# Altium footprint library AI.PcbLib: 137 footprints (part 4 of 9)
Each footprint in its own frame and in the unit in brackets; x right, y up, seen from the top. Pads: shape width x height; smd on the part's side, far side on the other; paste and mask are expansions set on the pad; w line width, h text height; cw(c..) or ccw(c..) is an arc to the next point about the centre after c.
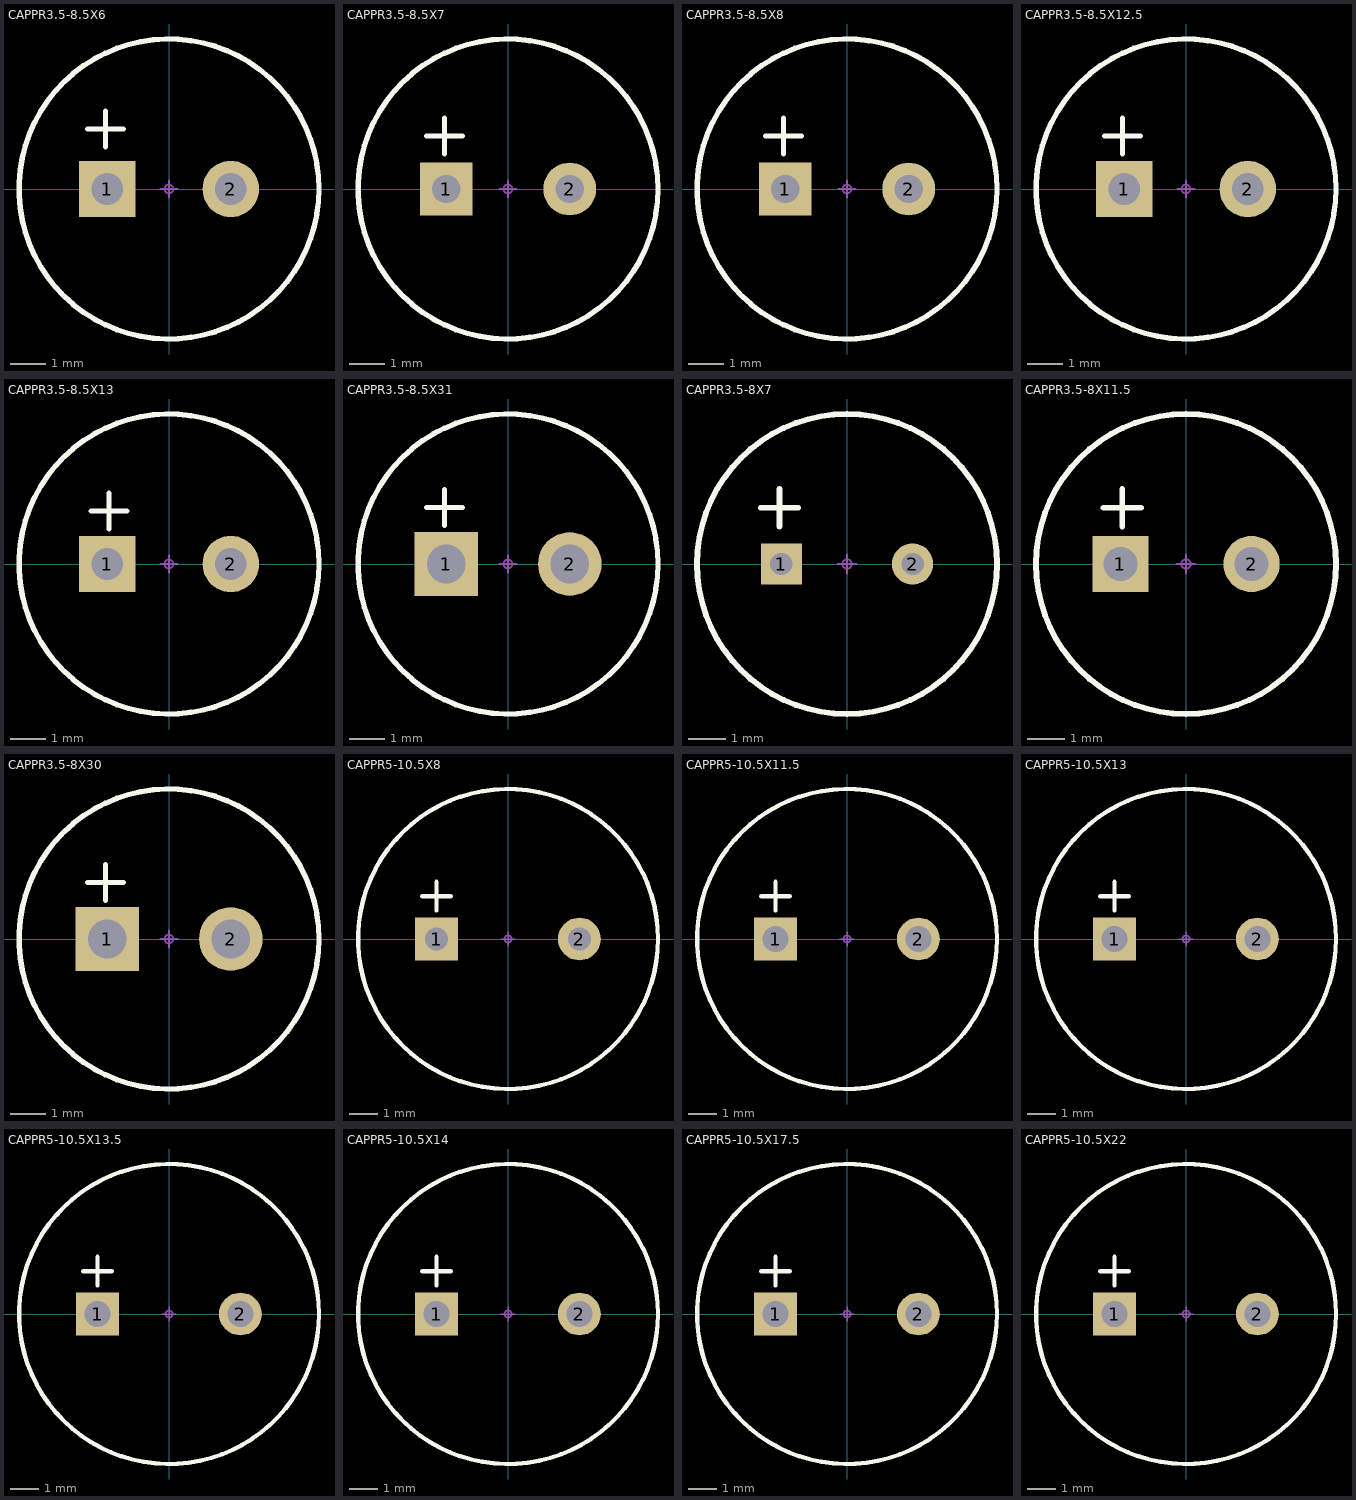
[diagram p3: the footprints below, top view; thin cyan lines are the x and y axes]

## CAPPR3.5-8.5X6 [mm]
pads (2):
  rect 1.6x1.6 hole 0.9: 1(-1.75,0)
  round 1.6 hole 0.9: 2(1.75,0)
Top Overlay:
  circle w0.152: c0,0 r4.25
  lines w0.152: -2.3,1.7 -1.3,1.7 ; -1.8,1.2 -1.8,2.2
Mechanical 15:
  circle w0.05: c0,0 r0.125
  lines w0.05: -0.25,0 0.25,0 ; 0,-0.25 0,0.25
3D body "CAPPR350-850X600.stp": height 6, standoff -3.6, extent -4.259,-4.259 4.241,4.241

## CAPPR3.5-8.5X7 [mm]
pads (2):
  rect 1.5x1.5 hole 0.8: 1(-1.75,0)
  round 1.5 hole 0.8: 2(1.75,0)
Top Overlay:
  circle w0.152: c0,0 r4.25
  lines w0.152: -2.3,1.5 -1.3,1.5 ; -1.8,1 -1.8,2
Mechanical 15:
  circle w0.05: c0,0 r0.125
  lines w0.05: -0.25,0 0.25,0 ; 0,-0.25 0,0.25
3D body "CAPPR350-850X700.stp": height 7, standoff -3.6, extent -4.25,-4.254 4.25,4.246

## CAPPR3.5-8.5X8 [mm]
pads (2):
  rect 1.5x1.5 hole 0.8: 1(-1.75,0)
  round 1.5 hole 0.8: 2(1.75,0)
Top Overlay:
  circle w0.152: c0,0 r4.25
  lines w0.152: -2.3,1.5 -1.3,1.5 ; -1.8,1 -1.8,2
Mechanical 15:
  circle w0.05: c0,0 r0.125
  lines w0.05: -0.25,0 0.25,0 ; 0,-0.25 0,0.25
3D body "CAPPR350-850X800.stp": height 8, standoff -3.6, extent -4.25,-4.25 4.25,4.25

## CAPPR3.5-8.5X12.5 [mm]
pads (2):
  rect 1.6x1.6 hole 0.9: 1(-1.75,0)
  round 1.6 hole 0.9: 2(1.75,0)
Top Overlay:
  circle w0.152: c0,0 r4.25
  lines w0.152: -2.3,1.5 -1.3,1.5 ; -1.8,1 -1.8,2
Mechanical 15:
  circle w0.05: c0,0 r0.125
  lines w0.05: -0.25,0 0.25,0 ; 0,-0.25 0,0.25
3D body "CAPPR350-850X1250.stp": height 12.5, standoff -3.6, extent -4.25,-4.25 4.25,4.25

## CAPPR3.5-8.5X13 [mm]
pads (2):
  rect 1.6x1.6 hole 0.9: 1(-1.75,0)
  round 1.6 hole 0.9: 2(1.75,0)
Top Overlay:
  circle w0.152: c0,0 r4.25
  lines w0.152: -2.2,1.5 -1.2,1.5 ; -1.7,1 -1.7,2
Mechanical 15:
  circle w0.05: c0,0 r0.125
  lines w0.05: -0.25,0 0.25,0 ; 0,-0.25 0,0.25
3D body "CAPPR350-850X1300.stp": height 13, standoff -3.6, extent -4.25,-4.25 4.25,4.25

## CAPPR3.5-8.5X31 [mm]
pads (2):
  rect 1.8x1.8 hole 1.1: 1(-1.75,0)
  round 1.8 hole 1.1: 2(1.75,0)
Top Overlay:
  circle w0.152: c0,0 r4.25
  lines w0.152: -2.3,1.6 -1.3,1.6 ; -1.8,1.1 -1.8,2.1
Mechanical 15:
  circle w0.05: c0,0 r0.125
  lines w0.05: -0.25,0 0.25,0 ; 0,-0.25 0,0.25
3D body "CAPPR350-850X3100.stp": height 31, standoff -3.8, extent -4.25,-4.25 4.25,4.25

## CAPPR3.5-8X7 [mm]
pads (2):
  rect 1.1x1.1 hole 0.6: 1(-1.75,0)
  round 1.1 hole 0.6: 2(1.75,0)
Top Overlay:
  circle w0.152: c0,0 r4
  lines w0.152: -2.3,1.5 -1.3,1.5 ; -1.8,1 -1.8,2
Mechanical 15:
  circle w0.05: c0,0 r0.125
  lines w0.05: -0.25,0 0.25,0 ; 0,-0.25 0,0.25
3D body "CAPPR350-800X700.stp": height 7, standoff -3.6, extent -4.259,-4.263 4.241,4.237

## CAPPR3.5-8X11.5 [mm]
pads (2):
  rect 1.5x1.5 hole 0.9: 1(-1.75,0)
  round 1.5 hole 0.9: 2(1.75,0)
Top Overlay:
  circle w0.152: c0,0 r4
  lines w0.152: -2.2,1.5 -1.2,1.5 ; -1.7,1 -1.7,2
Mechanical 15:
  circle w0.05: c0,0 r0.125
  lines w0.05: -0.25,0 0.25,0 ; 0,-0.25 0,0.25
3D body "CAPPR350-800X1150.stp": height 11.5, standoff -3.6, extent -4.012,-4.029 3.988,3.971

## CAPPR3.5-8X30 [mm] "Capacitor, Radial, Pin spacing 3.5mm - Body Diameter 8.5mm x Body Height 13mm"
height 13
pads (2):
  rect 1.8x1.8 hole 1.1: 1(-1.75,0)
  round 1.8 hole 1.1: 2(1.75,0)
Top Overlay:
  circle w0.152: c0,0 r4.25
  lines w0.152: -2.3,1.6 -1.3,1.6 ; -1.8,1.1 -1.8,2.1
Mechanical 15:
  circle w0.05: c0,0 r0.125
  lines w0.05: -0.25,0 0.25,0 ; 0,-0.25 0,0.25
3D body "CAPPR350-850X1300.stp": height 13, standoff -3.6, extent -4.25,-4.25 4.25,4.25

## CAPPR5-10.5X8 [mm]
pads (2):
  rect 1.5x1.5 hole 0.8: 1(-2.5,0)
  round 1.5 hole 0.8: 2(2.5,0)
Top Overlay:
  circle w0.152: c0,0 r5.25
  lines w0.152: -3,1.5 -2,1.5 ; -2.5,1 -2.5,2
Mechanical 15:
  circle w0.05: c0,0 r0.125
  lines w0.05: -0.25,0 0.25,0 ; 0,-0.25 0,0.25
3D body "CAPPR500-1050X800.stp": height 8, standoff -3.6, extent -5.25,-5.25 5.25,5.25

## CAPPR5-10.5X11.5 [mm]
pads (2):
  rect 1.5x1.5 hole 0.9: 1(-2.5,0)
  round 1.5 hole 0.9: 2(2.5,0)
Top Overlay:
  circle w0.152: c0,0 r5.25
  lines w0.152: -3,1.5 -2,1.5 ; -2.5,1 -2.5,2
Mechanical 15:
  circle w0.05: c0,0 r0.125
  lines w0.05: -0.25,0 0.25,0 ; 0,-0.25 0,0.25
3D body "CAPPR500-1050X1150.stp": height 11.5, standoff -3.6, extent -5.25,-5.25 5.25,5.25

## CAPPR5-10.5X13 [mm]
pads (2):
  rect 1.5x1.5 hole 0.9: 1(-2.5,0)
  round 1.5 hole 0.9: 2(2.5,0)
Top Overlay:
  circle w0.152: c0,0 r5.25
  lines w0.152: -3,1.5 -2,1.5 ; -2.5,1 -2.5,2
Mechanical 15:
  circle w0.05: c0,0 r0.125
  lines w0.05: -0.25,0 0.25,0 ; 0,-0.25 0,0.25
3D body "CAPPR500-1050X1300.stp": height 13, standoff -3.6, extent -5.25,-5.25 5.25,5.25

## CAPPR5-10.5X13.5 [mm]
pads (2):
  rect 1.5x1.5 hole 0.9: 1(-2.5,0)
  round 1.5 hole 0.9: 2(2.5,0)
Top Overlay:
  circle w0.152: c0,0 r5.25
  lines w0.152: -3,1.5 -2,1.5 ; -2.5,1 -2.5,2
Mechanical 15:
  circle w0.05: c0,0 r0.125
  lines w0.05: -0.25,0 0.25,0 ; 0,-0.25 0,0.25
3D body "CAPPR500-1050X1350.stp": height 13.5, standoff -3.6, extent -5.25,-5.25 5.25,5.25

## CAPPR5-10.5X14 [mm]
pads (2):
  rect 1.5x1.5 hole 0.9: 1(-2.5,0)
  round 1.5 hole 0.9: 2(2.5,0)
Top Overlay:
  circle w0.152: c0,0 r5.25
  lines w0.152: -3,1.5 -2,1.5 ; -2.5,1 -2.5,2
Mechanical 15:
  circle w0.05: c0,0 r0.125
  lines w0.05: -0.25,0 0.25,0 ; 0,-0.25 0,0.25
3D body "CAPPR500-1050X1400.stp": height 14, standoff -3.6, extent -5.25,-5.25 5.25,5.25

## CAPPR5-10.5X17.5 [mm]
pads (2):
  rect 1.5x1.5 hole 0.9: 1(-2.5,0)
  round 1.5 hole 0.9: 2(2.5,0)
Top Overlay:
  circle w0.152: c0,0 r5.25
  lines w0.152: -3,1.5 -2,1.5 ; -2.5,1 -2.5,2
Mechanical 15:
  circle w0.05: c0,0 r0.125
  lines w0.05: -0.25,0 0.25,0 ; 0,-0.25 0,0.25
3D body "CAPPR500-1050X1750.stp": height 17.5, standoff -3.6, extent -5.25,-5.25 5.25,5.25

## CAPPR5-10.5X22 [mm]
pads (2):
  rect 1.5x1.5 hole 0.9: 1(-2.5,0)
  round 1.5 hole 0.9: 2(2.5,0)
Top Overlay:
  circle w0.152: c0,0 r5.25
  lines w0.152: -3,1.5 -2,1.5 ; -2.5,1 -2.5,2
Mechanical 15:
  circle w0.05: c0,0 r0.125
  lines w0.05: -0.25,0 0.25,0 ; 0,-0.25 0,0.25
3D body "CAPPR500-1050X2200.stp": height 22, standoff -3.6, extent -5.25,-5.25 5.25,5.25